# Altium footprint library MH_DA_THU_VIEN_16122016.PcbLib: 531 footprints (part 13 of 34)
Each footprint in its own frame and in the unit in brackets; x right, y up, seen from the top. Pads: shape width x height; smd on the part's side, far side on the other; paste and mask are expansions set on the pad; w line width, h text height; cw(c..) or ccw(c..) is an arc to the next point about the centre after c.
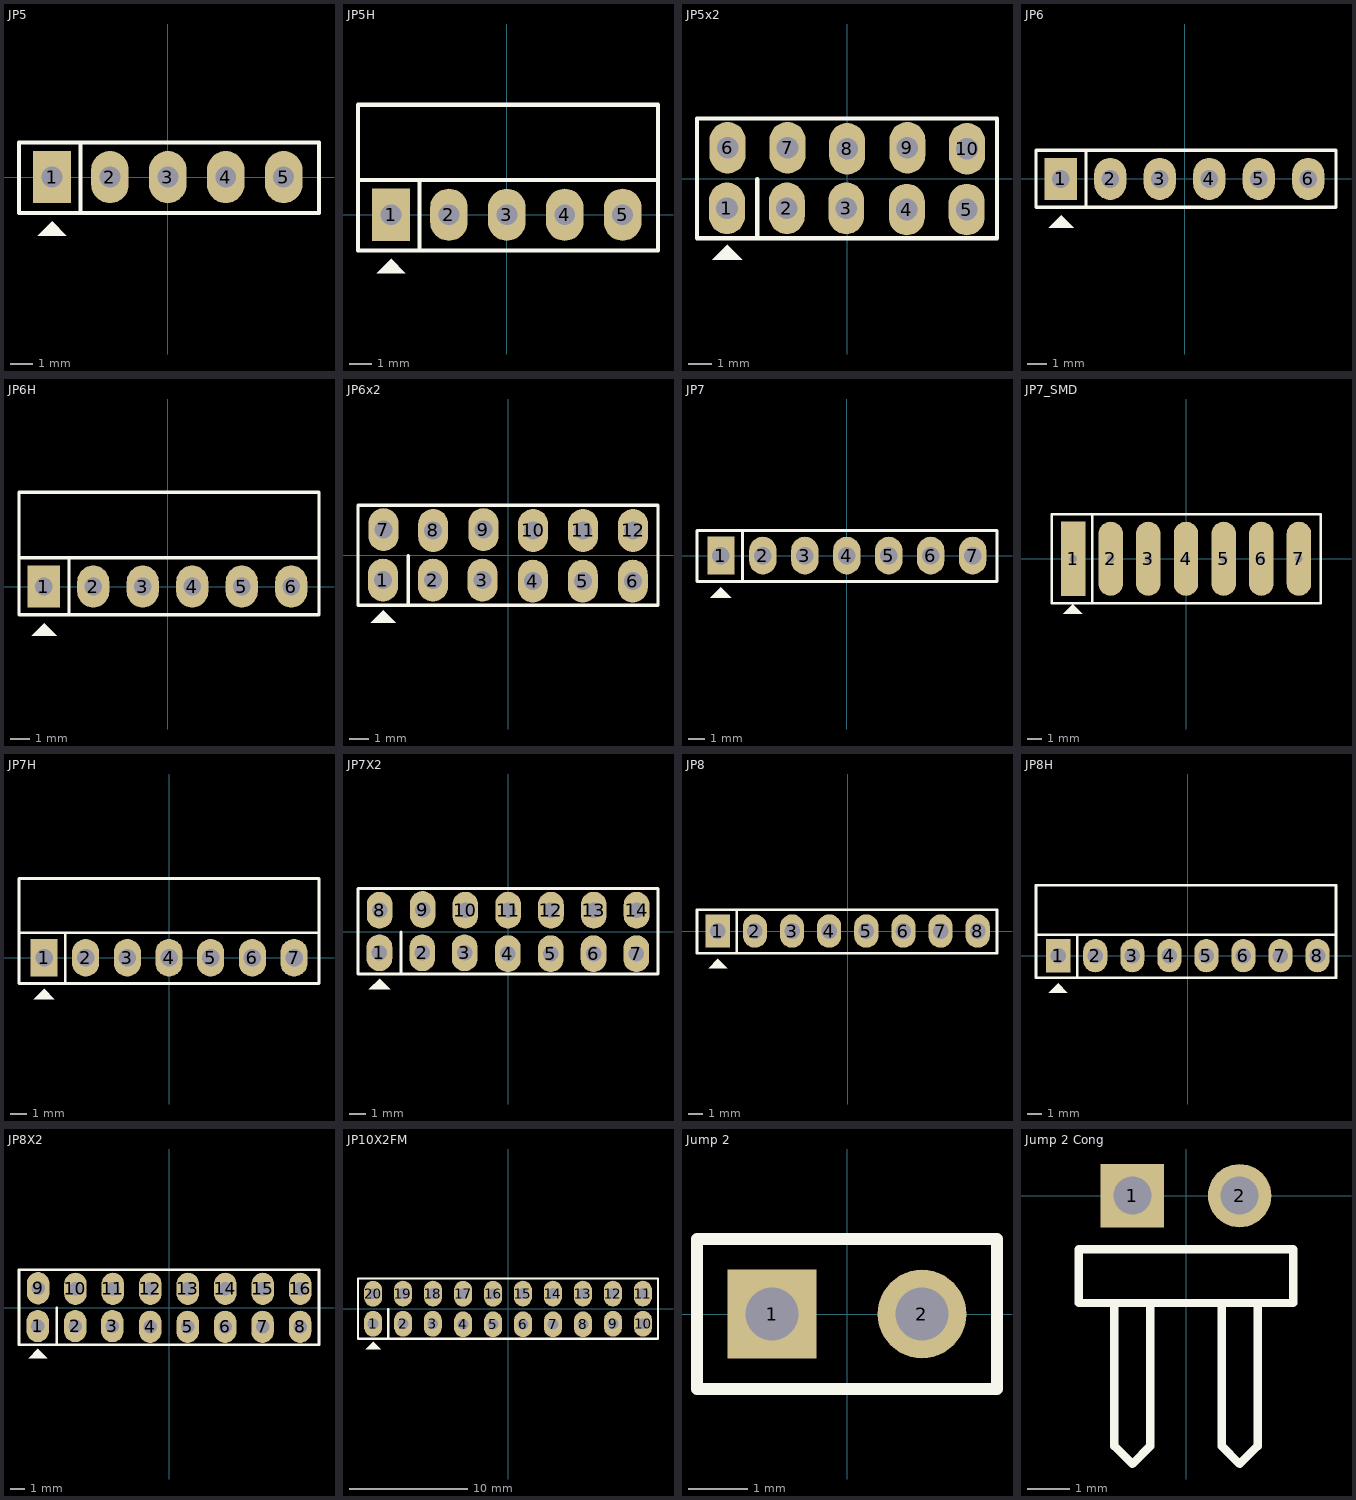
[diagram p12: the footprints below, top view; thin cyan lines are the x and y axes]

## JP5 [mil]
pads (5):
  rect 65x90 hole 36: 1(-200,0)
  oval 65x90 hole 36: 2(-100,0) 3(0,0) 4(100,0) 5(200,0)
Top Overlay:
  region: -200,-76 -225,-101 -175,-101
  lines w7: -151,-60 -151,58 ; -257,-62 261,-62 261,60 -257,60 -257,-62
3D body: height 323.43, standoff -117.51, extent -248.03,-53.43 248.03,45

## JP5H [mil]
pads (5):
  rect 65x90 hole 36: 1(-200,0)
  oval 65x90 hole 36: 2(-100,0) 3(0,0) 4(100,0) 5(200,0)
Top Overlay:
  region: -200,-76 -225,-101 -175,-101
  lines w7: -151,-60 -151,58 ; -257,60 -257,190 261,190 261,60 ; -257,60 261,60 ; -257,60 -257,-62 261,-62 261,60
3D body: height 99.03, standoff -93.89, extent -246.06,-14.96 246.07,423.63

## JP5x2 [mil]
pads (10):
  oval 60x86 hole 36: 1(-200.25,-49.5) 2(-100.25,-49.5) 3(-1.25,-49.5) 4(99.75,-51.5) 5(199.75,-51.5) 6(-199.25,51.5) 7(-99.25,51.5) 8(0.25,50) 9(100.75,51.5) 10(200.25,50)
Top Overlay:
  region: -199.75,-110 -224.75,-135 -174.75,-135
  lines w7: -149.75,-99 -149.75,-1 ; -250.25,-99.5 250.25,-99.5 250.25,100.5 -250.25,100.5 -250.25,0.5 -250.25,-99.5
3D body: height 335.25, standoff -117.51, extent -249.74,-99.99 250.26,100.01

## JP6 [mil]
pads (6):
  rect 65x85 hole 36: 1(-250,0)
  oval 65x85 hole 36: 2(-150,0) 3(-50,0) 4(50,0) 5(150,0) 6(250,0)
Top Overlay:
  region: -249,-74 -274,-99 -224,-99
  lines w7: -199,-57 -199,56 ; -300,-57 -300,58 306,58 306,-57 -300,-57
3D body: height 323.43, standoff -117.51, extent -298.03,-49.21 298.04,49.22

## JP6H [mil]
pads (6):
  rect 65x85 hole 36: 1(-250,0)
  oval 65x85 hole 36: 2(-150,0) 3(-50,0) 4(50,0) 5(150,0) 6(250,0)
Top Overlay:
  region: -249,-74 -274,-99 -224,-99
  lines w7: -199,-57 -199,56 ; -300,58 -300,-57 306,-57 306,58 ; -300,58 306,58 ; -300,58 -300,190 306,190 306,58
3D body: height 99.03, standoff -93.89, extent -296.06,-14.96 296.07,423.63

## JP6x2 [mil]
pads (12):
  oval 60x86 hole 36: 1(-250.25,-49.5) 2(-150.25,-49.5) 3(-51.25,-49.5) 4(49.75,-51.5) 5(149.75,-51.5) 6(249.75,-51.5) 7(-249.25,51.5) 8(-149.75,50) 9(-49.25,51.5) 10(50.25,50) 11(150.25,50) 12(250.25,50)
Top Overlay:
  region: -249.75,-110 -274.75,-135 -224.75,-135
  lines w7: -199.75,-99 -199.75,-1 ; -300.25,-99.5 -300.25,0.5 -300.25,100.5 300.25,100.5 300.25,-99.5 -300.25,-99.5
3D body: height 335.24, standoff -117.51, extent -299.74,-99.99 300.26,100.01

## JP7 [mil]
pads (7):
  rect 65x90 hole 42: 1(-300,0)
  oval 65x90 hole 42: 2(-200,0) 3(-100,0) 4(0,0) 5(100,0) 6(200,0) 7(300,0)
Top Overlay:
  region: -300,-75 -325,-100 -275,-100
  lines w7: -249,-58 -249,60 ; -357,-62 358,-62 358,60 -357,60 -357,-62
3D body: height 323.44, standoff -117.51, extent -350,-49.21 346.06,49.21

## JP7_SMD [mm]
pads (7):
  rect 1.651x5 hole 0.5: 1(-7.62,0)
  oval 1.651x5 hole 0.5: 2(-5.08,0) 3(-2.54,0) 4(0,0) 5(2.54,0) 6(5.08,0) 7(7.62,0)
Top Overlay:
  region: -7.645,-3.073 -8.28,-3.708 -7.01,-3.708
  lines w0.178: -6.325,-3 -6.325,3 ; -9.068,-3 -9.068,3 9.093,3 9.093,-3 -9.068,-3
3D body: height 8.22, standoff -2.98, extent -8.89,-1.25 8.79,1.25

## JP7H [mil]
pads (7):
  rect 65x90 hole 42: 1(-300,0)
  oval 65x90 hole 42: 2(-200,0) 3(-100,0) 4(0,0) 5(100,0) 6(200,0) 7(300,0)
Top Overlay:
  region: -300,-75 -325,-100 -275,-100
  lines w7: -357,60 360,60 ; -350,60 -360,60 ; -249,-58 -249,60 ; -360,60 -360,190 360,190 360,60 ; -360,60 -360,-62 360,-62 360,60
3D body: height 99.03, standoff -93.89, extent -346.06,-24.96 346.07,413.63

## JP7X2 [mil]
pads (14):
  oval 60x86 hole 36: 1(-300.25,-49.5) 2(-200.25,-49.5) 3(-101.25,-49.5) 4(-0.25,-51.5) 5(99.75,-51.5) 6(199.75,-51.5) 7(299.75,-51.5) 8(-299.75,50) 9(-199.25,51.5) 10(-99.75,50) 11(0.25,50) 12(100.25,50) 13(200.25,50) 14(300.25,50)
Top Overlay:
  region: -299.75,-110 -324.75,-135 -274.75,-135
  lines w7: -249.75,-99 -249.75,-1 ; -350.25,-99.5 -350.25,0.5 -350.25,100.5 350.25,100.5 350.25,-99.5 -350.25,-99.5
3D body: height 335.25, standoff -117.51, extent -349.74,-99.99 350.26,100.01

## JP8 [mil] "JP8"
height 200
pads (8):
  rect 65x90 hole 42: 1(-350,0)
  oval 65x90 hole 42: 2(-250,0) 3(-150,0) 4(-50,0) 5(50,0) 6(150,0) 7(250,0) 8(350,0)
Top Overlay:
  region: -350,-75 -375,-100 -325,-100
  lines w7: -299,-60 -299,56 ; -406,-60 -406,57 402,57 402,-60 -406,-60
3D body: height 323.43, standoff -117.51, extent -398.03,-50 398.03,48.43

## JP8H [mil]
pads (8):
  rect 65x90 hole 42: 1(-350,0)
  oval 65x90 hole 42: 2(-250,0) 3(-150,0) 4(-50,0) 5(50,0) 6(150,0) 7(250,0) 8(350,0)
Top Overlay:
  region: -350,-75 -375,-100 -325,-100
  lines w7: -299,-60 -299,56 ; -410,57 -410,-60 400,-60 400,57 ; -410,57 400,57 ; -410,57 -410,190 400,190 400,57
3D body: height 49.21, standoff -143.7, extent -396.06,-14.96 396.06,423.62

## JP8X2 [mil]
pads (16):
  oval 60x86 hole 36: 1(-350.25,-49.5) 2(-250.25,-49.5) 3(-151.25,-49.5) 4(-50.25,-51.5) 5(49.75,-51.5) 6(149.75,-51.5) 7(249.75,-51.5) 8(349.75,-51.5) 9(-349.25,51.5) 10(-249.75,50) 11(-149.75,50) 12(-49.75,50) 13(50.25,50) 14(150.25,50) 15(250.25,50) 16(350.25,50)
Top Overlay:
  region: -349.75,-110 -374.75,-135 -324.75,-135
  lines w7: -299.75,-99 -299.75,-1 ; -400.25,-99.5 -400.25,0.5 -400.25,100.5 400.25,100.5 400.25,-99.5 -400.25,-99.5
3D body: height 335.25, standoff -117.51, extent -399.74,-99.99 400.26,100.01

## JP10X2FM [mil]
pads (20):
  oval 60x86 hole 36: 1(-450,-49.25) 2(-350,-49.25) 3(-251,-49.25) 4(-150,-51.25) 5(-50,-51.25) 6(50,-51.25) 7(150,-51.25) 8(250,-51.25) 9(350,-49.25) 10(450,-49.25) 11(449.5,51.25) 12(349.5,51.25) 13(249.5,51.25) 14(149.5,51.25) 15(49.5,51.25) 16(-50,50.75) 17(-150,50.75) 18(-250.5,51.25) 19(-350.5,51.25) 20(-450,50.75)
Top Overlay:
  region: -449.5,-109.75 -474.5,-134.75 -424.5,-134.75
  lines w7: -500.5,101.25 499.5,101.25 ; -500,100.75 -500,0.75 -500,-99.25 500,-99.25 500,100.75 ; -399.5,-98.75 -399.5,-0.75
3D body: height 335.25, standoff -125.38, extent -504.92,-97.68 504.92,99.18

## Jump 2 [mm] "Jump 2P 2.54"
pads (2):
  rect 1.5x1.5 hole 0.9: 1(-1.27,0)
  round 1.5 hole 0.9: 2(1.27,0)
Top Overlay:
  lines w0.2: -2.54,-1.27 -2.54,1.27 2.54,1.27 2.54,-1.27 -2.54,-1.27
3D body: height 1.5, standoff 0, extent 0,-1.27 2.54,1.27
3D body: height 7, standoff -1, extent 0.864,-0.406 1.66,0.392
3D body: height 7, standoff -1, extent -1.676,-0.406 -0.88,0.392
3D body: height 1.5, standoff 0, extent -2.54,-1.27 0,1.27

## Jump 2 Cong [mm] "Jump 2P 2.54 Cong"
pads (2):
  rect 1.5x1.5 hole 0.9: 1(-1.27,0)
  round 1.5 hole 0.9: 2(1.27,0)
Top Overlay:
  lines w0.2: -1.693,-2.54 -1.693,-5.927 -1.27,-6.35 -0.847,-5.927 -0.847,-2.54 ; 0.847,-2.54 0.847,-5.927 1.27,-6.35 1.693,-5.927 1.693,-2.54 ; -2.54,-2.54 -2.54,-1.27 2.54,-1.27 2.54,-2.54 -2.54,-2.54
3D body: height 4.33, standoff -3, extent -2.54,-7 2.54,1.27